# Altium footprint library My_PCB_6_28.PcbLib: 151 footprints (part 10 of 10)
Each footprint in its own frame and in the unit in brackets; x right, y up, seen from the top. Pads: shape width x height; smd on the part's side, far side on the other; paste and mask are expansions set on the pad; w line width, h text height; cw(c..) or ccw(c..) is an arc to the next point about the centre after c.
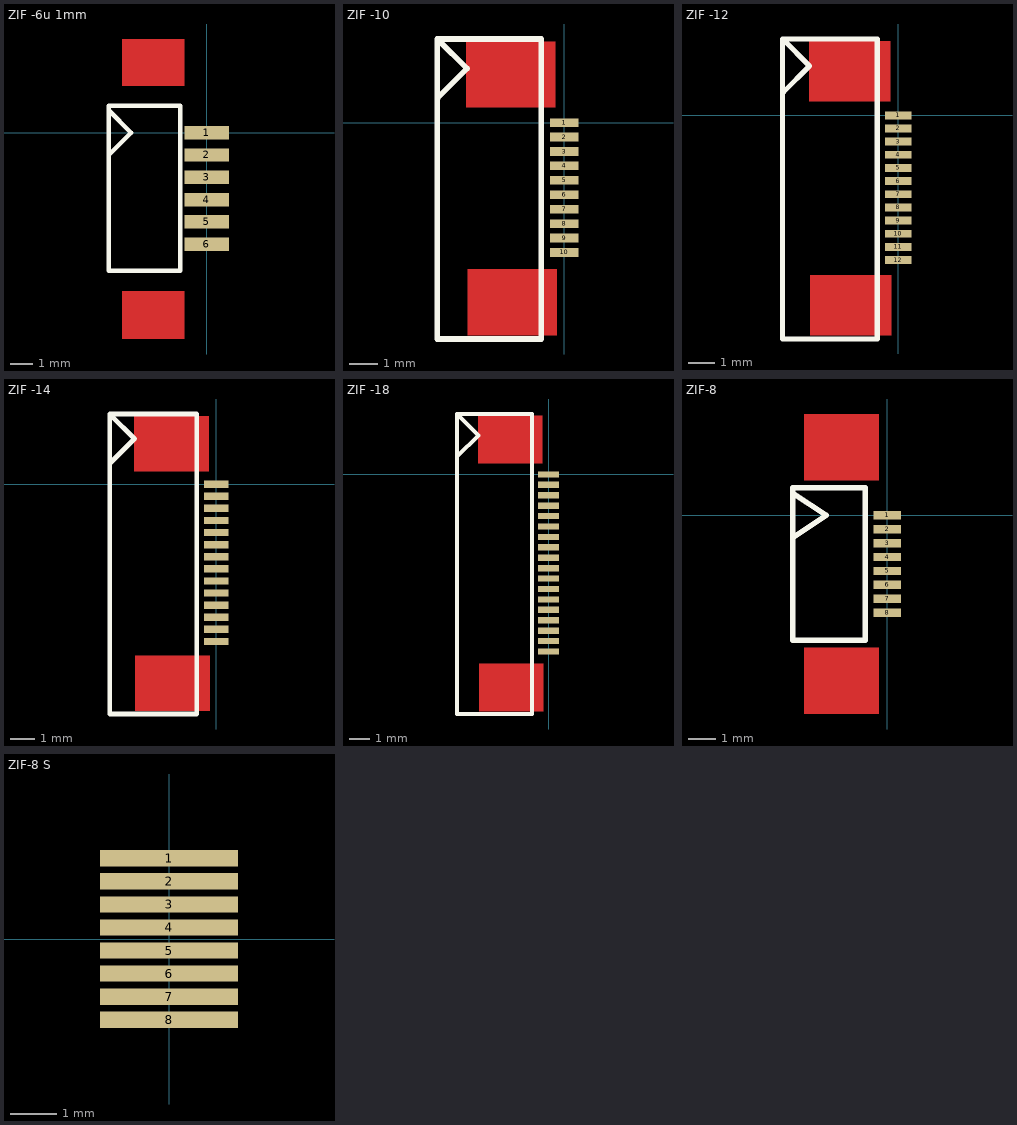
[diagram p9: the footprints below, top view; thin cyan lines are the x and y axes]

## ZIF -6u 1mm [mm]
height 2
pads (6):
  rect 2x0.6 smd: 1(0,0) 2(0,-1) 3(0,-2) 4(0,-3) 5(0,-4) 6(0,-5)
Top Layer:
  rectangle: -3.8,-9.25 -1,-7.1
  rectangle: -3.8,2.1 -1,4.2
Top Overlay:
  lines w0.2: -4.4,-1 -3.4,0 -4.4,1 ; -4.4,-6.2 -1.2,-6.2 -1.2,1.2 -4.4,1.2 -4.4,-6.2

## ZIF -10 [mm]
height 2
pads (10):
  rect 1x0.3 smd: 1(0,0) 2(0,-0.5) 3(0,-1) 4(0,-1.5) 5(0,-2) 6(0,-2.5) 7(0,-3) 8(0,-3.5) 9(0,-4) 10(0,-4.5)
Top Layer:
  rectangle: -3.4,0.52 -0.3,2.82
  rectangle: -3.35,-7.375 -0.25,-5.075
Top Overlay:
  lines w0.2: -4.4,-7.5 -4.4,2.9 -0.8,2.9 -0.8,-7.5 -4.375,-7.5 ; -4.375,0.875 -3.375,1.875 -4.375,2.875

## ZIF -12 [mm]
height 2
pads (12):
  rect 1x0.3 smd: 1(0,0) 2(0,-0.5) 3(0,-1) 4(0,-1.5) 5(0,-2) 6(0,-2.5) 7(0,-3) 8(0,-3.5) 9(0,-4) 10(0,-4.5) 11(0,-5) 12(0,-5.5)
Top Layer:
  rectangle: -3.4,0.52 -0.3,2.82
  rectangle: -3.35,-8.375 -0.25,-6.075
Top Overlay:
  lines w0.2: -4.4,-8.5 -4.4,2.9 -0.8,2.9 -0.8,-8.5 -4.375,-8.5 ; -4.375,0.875 -3.375,1.875 -4.375,2.875

## ZIF -14 [mm]
height 2
pads (14):
  rect 1x0.3 smd: 1(0,0) 2(0,-0.5) 3(0,-1) 4(0,-1.5) 5(0,-2) 6(0,-2.5) 7(0,-3) 8(0,-3.5) 9(0,-4) 10(0,-4.5) 11(0,-5) 12(0,-5.5) 13(0,-6) 14(0,-6.5)
Top Layer:
  rectangle: -3.35,-9.375 -0.25,-7.075
  rectangle: -3.4,0.52 -0.3,2.82
Top Overlay:
  lines w0.2: -4.4,-9.5 -4.4,2.9 -0.8,2.9 -0.8,-9.5 -4.375,-9.5 ; -4.375,0.875 -3.375,1.875 -4.375,2.875
Top Paste:
  rectangle: -3.15,-9.15 -0.45,-7.3
  rectangle: -3.2,0.75 -0.5,2.6
Top Solder:
  rectangle: -3.35,-9.4 -0.25,-7.05
  rectangle: -3.4,0.5 -0.3,2.85
3D body: height 2.01, standoff 0.01, extent -5,-9.7 0.3,3.2

## ZIF -18 [mm]
height 2
pads (18):
  rect 1x0.3 smd: 1(0,0) 2(0,-0.5) 3(0,-1) 4(0,-1.5) 5(0,-2) 6(0,-2.5) 7(0,-3) 8(0,-3.5) 9(0,-4) 10(0,-4.5) 11(0,-5) 12(0,-5.5) 13(0,-6) 14(0,-6.5) 15(0,-7) 16(0,-7.5) 17(0,-8) 18(0,-8.5)
Top Layer:
  rectangle: -3.35,-11.375 -0.25,-9.075
  rectangle: -3.4,0.52 -0.3,2.82
Top Overlay:
  lines w0.2: -4.4,-11.5 -4.4,2.9 -0.8,2.9 -0.8,-11.5 -4.375,-11.5 ; -4.375,0.875 -3.375,1.875 -4.375,2.875

## ZIF-8 [mm]
height 1.7
pads (8):
  rect 1x0.3 smd: 1(0,0) 2(0,-0.5) 3(0,-1) 4(0,-1.5) 5(0,-2) 6(0,-2.5) 7(0,-3) 8(0,-3.5)
Top Layer:
  rectangle: -3,1.25 -0.3,3.65
  rectangle: -3,-7.15 -0.3,-4.75
Top Overlay:
  lines w0.2: -3.4,-0.8 -2.2,0 -3.4,0.8 ; -3.4,-4.5 -3.4,1 -0.8,1 -0.8,-4.5 -3.4,-4.5

## ZIF-8 S [mm]
pads (8):
  rect 3x0.35 smd: 1(0,1.75) 2(0,1.25) 3(0,0.75) 4(0,0.25) 5(0,-0.25) 6(0,-0.75) 7(0,-1.25) 8(0,-1.75)